# Altium footprint library 3.01-按键按钮.PcbLib: 68 footprints (part 5 of 5)
Each footprint in its own frame and in the unit in brackets; x right, y up, seen from the top. Pads: shape width x height; smd on the part's side, far side on the other; paste and mask are expansions set on the pad; w line width, h text height; cw(c..) or ccw(c..) is an arc to the next point about the centre after c.
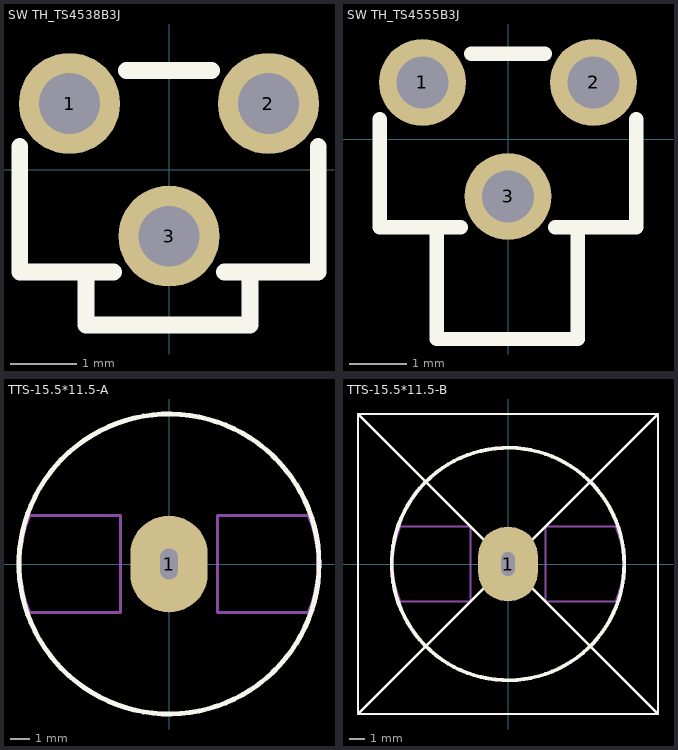
[diagram p4: the footprints below, top view; thin cyan lines are the x and y axes]

## SW TH_TS4538B3J [mil]
pads (3):
  round 60 hole 36: 1(-59.05,39.37) 2(59.05,39.37) 3(0,-39.37)
Top Overlay:
  lines w10: -88.58,13.79 -88.58,-60.63 -32.8,-60.63 ; -49.21,-60.63 -49.21,-92.13 48.03,-92.13 48.03,-60.63 ; -25.29,59.05 25.29,59.05 ; 32.8,-60.63 88.58,-60.63 88.58,13.79

## SW TH_TS4555B3J [mil]
pads (3):
  round 60 hole 36: 1(-59.05,39.37) 2(59.05,39.37) 3(0,-39.37)
Top Overlay:
  lines w10: -88.58,13.79 -88.58,-60.63 -32.8,-60.63 ; -49.21,-60.63 -49.22,-137.81 48.03,-137.81 48.03,-60.63 ; -25.29,59.05 25.29,59.05 ; 32.8,-60.63 88.58,-60.63 88.58,13.79

## TTS-15.5*11.5-A [mm] "弹簧按键15.5mm*11.5mm(直径*高度）"
pads (1):
  oval 4x5 hole 0.9 slot 1.6 at 90 deg: 1(0,0)
Top Overlay:
  circle w0.254: c0,0 r7.75
Mechanical 15:
  lines w0.152: -7.25,-2.5 -2.5,-2.5 -2.5,2.5 -3,2.5 -7.25,2.5 ; 7.25,-2.5 2.5,-2.5 2.5,2.5 3,2.5 7.25,2.5
  lines w0.254: -7.25,-2.5 cw(c-1.25,0) -7.25,2.5 ; 7.25,-2.5 ccw(c1.25,0) 7.25,2.5
3D body "弹?": height 12.9, standoff -2.5, extent -7.75,-7.75 7.75,7.75

## TTS-15.5*11.5-B [mm] "弹簧按键15.5mm*11.5mm(直径*高度）          淘宝ID:黄晶宝石"
pads (1):
  oval 4x5 hole 0.9 slot 1.6 at 90 deg: 1(0,0)
Top Overlay:
  circle w0.254: c0,0 r7.75
  lines w0.152: -10,-10 10,-10 ; -10,-10 -10,0 -10,10 ; -10,-10 10,10 ; -10,10 10,10 ; -10,10 10,-10 ; 10,-10 10,10
Mechanical 15:
  lines w0.152: -7.25,-2.5 -2.5,-2.5 -2.5,2.5 -3,2.5 -7.25,2.5 ; 7.25,-2.5 2.5,-2.5 2.5,2.5 3,2.5 7.25,2.5
  lines w0.254: -7.25,-2.5 cw(c-1.25,0) -7.25,2.5 ; 7.25,-2.5 ccw(c1.25,0) 7.25,2.5
3D body "弹?": height 12.9, standoff -2.5, extent -7.75,-7.75 7.75,7.75